# Altium footprint library SMT.PcbLib: 379 footprints (part 12 of 24) (continued)
## QFN50P800X800X100-57N [mm] "QFN, 56-Leads, Body 8,00x8,00mm, Pitch 0,50mm, Thermal Pad 6,25x6,25mm, IPC Medium Density"
height 1
pads (57):
  rrect50% 0.9x0.3 smd mask+0.03: 1(-3.95,3.25) 2(-3.95,2.75) 3(-3.95,2.25) 4(-3.95,1.75) 5(-3.95,1.25) 6(-3.95,0.75) 7(-3.95,0.25) 8(-3.95,-0.25) 9(-3.95,-0.75) 10(-3.95,-1.25) 11(-3.95,-1.75) 12(-3.95,-2.25) 13(-3.95,-2.75) 14(-3.95,-3.25) 29(3.95,-3.25) 30(3.95,-2.75) 31(3.95,-2.25) 32(3.95,-1.75) 33(3.95,-1.25) 34(3.95,-0.75) 35(3.95,-0.25) 36(3.95,0.25) 37(3.95,0.75) 38(3.95,1.25) 39(3.95,1.75) 40(3.95,2.25) 41(3.95,2.75) 42(3.95,3.25)
  rrect50% 0.3x0.9 smd mask+0.03: 15(-3.25,-3.95) 16(-2.75,-3.95) 17(-2.25,-3.95) 18(-1.75,-3.95) 19(-1.25,-3.95) 20(-0.75,-3.95) 21(-0.25,-3.95) 22(0.25,-3.95) 23(0.75,-3.95) 24(1.25,-3.95) 25(1.75,-3.95) 26(2.25,-3.95) 27(2.75,-3.95) 28(3.25,-3.95) 43(3.25,3.95) 44(2.75,3.95) 45(2.25,3.95) 46(1.75,3.95) 47(1.25,3.95) 48(0.75,3.95) 49(0.25,3.95) 50(-0.25,3.95) 51(-0.75,3.95) 52(-1.25,3.95) 53(-1.75,3.95) 54(-2.25,3.95) 55(-2.75,3.95) 56(-3.25,3.95)
  rect 6.25x6.25 hole 0.3 paste+0 mask-5: EPAD(0,0)
via 2.625,0.025 diameter 0.6 hole 0.3
via 1.325,0 diameter 0.6 hole 0.3
via 2.625,2.625 diameter 0.6 hole 0.3
via 2.625,-2.625 diameter 0.6 hole 0.3
via 2.625,-1.375 diameter 0.6 hole 0.3
via 2.625,1.25 diameter 0.6 hole 0.3
via 1.325,2.625 diameter 0.6 hole 0.3
via 1.325,-2.625 diameter 0.6 hole 0.3
via 1.325,-1.375 diameter 0.6 hole 0.3
via 1.325,1.25 diameter 0.6 hole 0.3
via 0,1.25 diameter 0.6 hole 0.3
via 0,-1.375 diameter 0.6 hole 0.3
via -2.625,-1.375 diameter 0.6 hole 0.3
via -2.625,1.25 diameter 0.6 hole 0.3
via -1.325,2.625 diameter 0.6 hole 0.3
via -1.325,0 diameter 0.6 hole 0.3
via -1.325,-1.375 diameter 0.6 hole 0.3
via -2.625,2.625 diameter 0.6 hole 0.3
via -2.625,-2.625 diameter 0.6 hole 0.3
via 0,-2.625 diameter 0.6 hole 0.3
via 0,2.625 diameter 0.6 hole 0.3
via -2.625,0 diameter 0.6 hole 0.3
via -1.325,-2.625 diameter 0.6 hole 0.3
via -1.325,1.25 diameter 0.6 hole 0.3
Top Overlay:
  circle w0.15: c-4.95,3.25 r0.25
  lines w0.15: -4.15,-3.8 -4.15,-4.15 -3.8,-4.15 ; -4.15,3.8 -4.15,4.15 -3.8,4.15 ; 3.8,-4.15 4.15,-4.15 4.15,-3.8 ; 3.8,4.15 4.15,4.15 4.15,3.8
Top Paste:
  region: 3.075,-0.45 3.075,0.45 2.175,0.45 2.175,-0.45
  region: 3.075,2.175 3.075,3.075 2.175,3.075 2.175,2.175
  region: 3.075,-3.075 3.075,-2.175 2.175,-2.175 2.175,-3.075
  region: 3.075,-1.825 3.075,-0.925 2.175,-0.925 2.175,-1.825
  region: 3.075,0.8 3.075,1.7 2.175,1.7 2.175,0.8
  region: 1.775,-0.45 1.775,0.45 0.875,0.45 0.875,-0.45
  region: 1.775,2.175 1.775,3.075 0.875,3.075 0.875,2.175
  region: 1.775,-3.075 1.775,-2.175 0.875,-2.175 0.875,-3.075
  region: 1.775,-1.825 1.775,-0.925 0.875,-0.925 0.875,-1.825
  region: 1.775,0.8 1.775,1.7 0.875,1.7 0.875,0.8
  region: 0.45,0.8 0.45,1.7 -0.45,1.7 -0.45,0.8
  region: 0.45,-1.825 0.45,-0.925 -0.45,-0.925 -0.45,-1.825
  region: -2.175,-1.825 -2.175,-0.925 -3.075,-0.925 -3.075,-1.825
  region: -2.175,0.8 -2.175,1.7 -3.075,1.7 -3.075,0.8
  region: -0.875,2.175 -0.875,3.075 -1.775,3.075 -1.775,2.175
  region: -0.875,-0.45 -0.875,0.45 -1.775,0.45 -1.775,-0.45
  region: -0.875,-1.825 -0.875,-0.925 -1.775,-0.925 -1.775,-1.825
  region: -0.875,0.8 -0.875,1.7 -1.775,1.7 -1.775,0.8
  region: -2.175,2.175 -2.175,3.075 -3.075,3.075 -3.075,2.175
  region: -2.175,-3.075 -2.175,-2.175 -3.075,-2.175 -3.075,-3.075
  region: 0.45,-3.075 0.45,-2.175 -0.45,-2.175 -0.45,-3.075
  region: 0.45,2.175 0.45,3.075 -0.45,3.075 -0.45,2.175
  region: -2.175,-0.45 -2.175,0.45 -3.075,0.45 -3.075,-0.45
  region: 0.45,-0.45 0.45,0.45 -0.45,0.45 -0.45,-0.45
  region: -0.875,-3.075 -0.875,-2.175 -1.775,-2.175 -1.775,-3.075
Top Solder:
  region: 3.125,-0.5 3.125,0.5 2.125,0.5 2.125,-0.5
  region: 3.125,2.125 3.125,3.125 2.125,3.125 2.125,2.125
  region: 3.125,-3.125 3.125,-2.125 2.125,-2.125 2.125,-3.125
  region: 3.125,-1.875 3.125,-0.875 2.125,-0.875 2.125,-1.875
  region: 3.125,0.75 3.125,1.75 2.125,1.75 2.125,0.75
  region: 1.825,-0.5 1.825,0.5 0.825,0.5 0.825,-0.5
  region: 1.825,2.125 1.825,3.125 0.825,3.125 0.825,2.125
  region: 1.825,-3.125 1.825,-2.125 0.825,-2.125 0.825,-3.125
  region: 1.825,-1.875 1.825,-0.875 0.825,-0.875 0.825,-1.875
  region: 1.825,0.75 1.825,1.75 0.825,1.75 0.825,0.75
  region: 0.5,0.75 0.5,1.75 -0.5,1.75 -0.5,0.75
  region: 0.5,-1.875 0.5,-0.875 -0.5,-0.875 -0.5,-1.875
  region: -2.125,-1.875 -2.125,-0.875 -3.125,-0.875 -3.125,-1.875
  region: -2.125,0.75 -2.125,1.75 -3.125,1.75 -3.125,0.75
  region: -0.825,2.125 -0.825,3.125 -1.825,3.125 -1.825,2.125
  region: -0.825,-0.5 -0.825,0.5 -1.825,0.5 -1.825,-0.5
  region: -0.825,-1.875 -0.825,-0.875 -1.825,-0.875 -1.825,-1.875
  region: -0.825,0.75 -0.825,1.75 -1.825,1.75 -1.825,0.75
  region: -2.125,2.125 -2.125,3.125 -3.125,3.125 -3.125,2.125
  region: -2.125,-3.125 -2.125,-2.125 -3.125,-2.125 -3.125,-3.125
  region: 0.5,-3.125 0.5,-2.125 -0.5,-2.125 -0.5,-3.125
  region: 0.5,2.125 0.5,3.125 -0.5,3.125 -0.5,2.125
  region: -2.125,-0.5 -2.125,0.5 -3.125,0.5 -3.125,-0.5
  region: -0.825,-3.125 -0.825,-2.125 -1.825,-2.125 -1.825,-3.125
  region: 0.5,-0.5 0.5,0.5 -0.5,0.5 -0.5,-0.5
Bottom Solder:
  region: 3.175,-3.175 3.175,3.175 -3.175,3.175 -3.175,-3.175
Mechanical 1:
  circle w0.2: c-3.1,3.1 r0.25
  lines w0.2: -4,-4 -4,4 4,4 4,-4 -4,-4
3D body "QFN56-8X8-5_2.STEP": height 0.92, standoff 0.02, extent -4,-4 4,4

## QFN50P800X800X100_HS-57N [mm] "QFN, 56-Leads, Body 8,00x8,00mm, Pitch 0,50mm, Thermal Pad 4,37x4,37mm, IPC Medium Density"
height 1
pads (57):
  rrect50% 0.9x0.3 smd mask+0.04: 1(-4.025,3.25) 2(-4.025,2.75) 3(-4.025,2.25) 4(-4.025,1.75) 5(-4.025,1.25) 6(-4.025,0.75) 7(-4.025,0.25) 8(-4.025,-0.25) 9(-4.025,-0.75) 10(-4.025,-1.25) 11(-4.025,-1.75) 12(-4.025,-2.25) 13(-4.025,-2.75) 14(-4.025,-3.25) 29(4.025,-3.25) 30(4.025,-2.75) 31(4.025,-2.25) 32(4.025,-1.75) 33(4.025,-1.25) 34(4.025,-0.75) 35(4.025,-0.25) 36(4.025,0.25) 37(4.025,0.75) 38(4.025,1.25) 39(4.025,1.75) 40(4.025,2.25) 41(4.025,2.75) 42(4.025,3.25)
  rrect50% 0.3x0.9 smd mask+0.04: 15(-3.25,-4.025) 16(-2.75,-4.025) 17(-2.25,-4.025) 18(-1.75,-4.025) 19(-1.25,-4.025) 20(-0.75,-4.025) 21(-0.25,-4.025) 22(0.25,-4.025) 23(0.75,-4.025) 24(1.25,-4.025) 25(1.75,-4.025) 26(2.25,-4.025) 27(2.75,-4.025) 28(3.25,-4.025) 43(3.25,4.025) 44(2.75,4.025) 45(2.25,4.025) 46(1.75,4.025) 47(1.25,4.025) 48(0.75,4.025) 49(0.25,4.025) 50(-0.25,4.025) 51(-0.75,4.025) 52(-1.25,4.025) 53(-1.75,4.025) 54(-2.25,4.025) 55(-2.75,4.025) 56(-3.25,4.025)
  rect 4.37x4.37 hole 0.3 copper offset 0.55,0.55 mask-10: EPAD(-0.55,-0.55)
via -1.65,1.65 diameter 0.7 hole 0.3
via -0.55,1.65 diameter 0.7 hole 0.3
via -1.65,0.55 diameter 0.7 hole 0.3
via -0.55,0.55 diameter 0.7 hole 0.3
via -1.65,-0.55 diameter 0.7 hole 0.3
via -1.65,-1.65 diameter 0.7 hole 0.3
via -0.55,-1.65 diameter 0.7 hole 0.3
via 0.55,-0.55 diameter 0.7 hole 0.3
via 1.65,-0.55 diameter 0.7 hole 0.3
via 0.55,-1.65 diameter 0.7 hole 0.3
via 1.65,-1.65 diameter 0.7 hole 0.3
via 0.55,1.65 diameter 0.7 hole 0.3
via 1.65,1.65 diameter 0.7 hole 0.3
via 1.65,0.55 diameter 0.7 hole 0.3
via 0.55,0.55 diameter 0.7 hole 0.3
Top Overlay:
  circle w0.15: c-4.8,4 r0.25
  lines w0.15: -4.2,3.6 -3.6,4.2 ; -4.1,-3.7 -3.6,-4.2 ; 3.6,-4.2 4.2,-3.6 ; 3.6,4.2 4.2,3.6
Top Paste:
  region: 1.7,-0.3 0.4,-0.3 0.4,-1.7 1.7,-1.7
  rectangle: -1.7,-1.7 -0.4,-0.3
  rectangle: -1.7,0.3 -0.4,1.7
  region: 1.7,1.7 0.4,1.7 0.4,0.3 1.7,0.3
Top Solder:
  region: 1.8,-0.2 0.3,-0.2 0.3,-1.8 1.8,-1.8
  rectangle: -1.8,-1.8 -0.3,-0.2
  rectangle: -1.8,0.2 -0.3,1.8
  region: 1.8,1.8 0.3,1.8 0.3,0.2 1.8,0.2
Mechanical 1:
  circle w0.2: c-3.05,3.05 r0.25
  lines w0.2: -4,-3.4 -3.4,-4 3.4,-4 4,-3.4 4,3.4 3.4,4 -3.4,4 -4,3.4 -4,-3.4
3D body "QFN50P800X800X100_HS-57N.step": height 1, standoff 0, extent -4.001,-4.001 4.001,4.001

## QFN50P900X900X80_HS63x63-65N [mm] "QFN, 64-Leads, Body 9,00x9,00mm, Pitch 0,50mm, Thermal Pad 6,2x6,2mm, IPC Medium Density"
height 0.8
pads (65):
  rrect50% 0.9x0.3 smd mask+0.05: 1(-4.525,3.75) 2(-4.525,3.25) 3(-4.525,2.75) 4(-4.525,2.25) 5(-4.525,1.75) 6(-4.525,1.25) 7(-4.525,0.75) 8(-4.525,0.25) 9(-4.525,-0.25) 10(-4.525,-0.75) 11(-4.525,-1.25) 12(-4.525,-1.75) 13(-4.525,-2.25) 14(-4.525,-2.75) 15(-4.525,-3.25) 16(-4.525,-3.75) 33(4.525,-3.75) 34(4.525,-3.25) 35(4.525,-2.75) 36(4.525,-2.25) 37(4.525,-1.75) 38(4.525,-1.25) 39(4.525,-0.75) 40(4.525,-0.25) 41(4.525,0.25) 42(4.525,0.75) 43(4.525,1.25) 44(4.525,1.75) 45(4.525,2.25) 46(4.525,2.75) 47(4.525,3.25) 48(4.525,3.75)
  rrect50% 0.3x0.9 smd mask+0.05: 17(-3.75,-4.525) 18(-3.25,-4.525) 19(-2.75,-4.525) 20(-2.25,-4.525) 21(-1.75,-4.525) 22(-1.25,-4.525) 23(-0.75,-4.525) 24(-0.25,-4.525) 25(0.25,-4.525) 26(0.75,-4.525) 27(1.25,-4.525) 28(1.75,-4.525) 29(2.25,-4.525) 30(2.75,-4.525) 31(3.25,-4.525) 32(3.75,-4.525) 49(3.75,4.525) 50(3.25,4.525) 51(2.75,4.525) 52(2.25,4.525) 53(1.75,4.525) 54(1.25,4.525) 55(0.75,4.525) 56(0.25,4.525) 57(-0.25,4.525) 58(-0.75,4.525) 59(-1.25,4.525) 60(-1.75,4.525) 61(-2.25,4.525) 62(-2.75,4.525) 63(-3.25,4.525) 64(-3.75,4.525)
  rect 6.3x6.3 hole 0.3 copper offset 0.5,-0.5 mask+0.05: EPAD(-0.5,0.5)
via 0.5,-0.5 diameter 0.6 hole 0.3
via -0.5,-0.5 diameter 0.6 hole 0.3
via -0.5,2.71 diameter 0.6 hole 0.3
via -0.5,1.71 diameter 0.6 hole 0.3
via 0.5,1.71 diameter 0.6 hole 0.3
via -0.5,-1.71 diameter 0.6 hole 0.3
via -0.5,-2.71 diameter 0.6 hole 0.3
via 0.5,-2.71 diameter 0.6 hole 0.3
via 0.5,-1.71 diameter 0.6 hole 0.3
via 0.5,2.71 diameter 0.6 hole 0.3
via 1.71,2.71 diameter 0.6 hole 0.3
via 2.71,2.71 diameter 0.6 hole 0.3
via 2.71,1.71 diameter 0.6 hole 0.3
via 1.71,1.71 diameter 0.6 hole 0.3
via 1.71,0.5 diameter 0.6 hole 0.3
via 2.71,0.5 diameter 0.6 hole 0.3
via 2.71,-0.5 diameter 0.6 hole 0.3
via 1.71,-0.5 diameter 0.6 hole 0.3
via 1.71,-1.71 diameter 0.6 hole 0.3
via 2.71,-1.71 diameter 0.6 hole 0.3
via 2.71,-2.71 diameter 0.6 hole 0.3
via 1.71,-2.71 diameter 0.6 hole 0.3
via -1.71,1.71 diameter 0.6 hole 0.3
via -2.71,1.71 diameter 0.6 hole 0.3
via -2.71,2.71 diameter 0.6 hole 0.3
via -1.71,2.71 diameter 0.6 hole 0.3
via -1.71,-0.5 diameter 0.6 hole 0.3
via -2.71,-0.5 diameter 0.6 hole 0.3
via -2.71,0.5 diameter 0.6 hole 0.3
via -1.71,0.5 diameter 0.6 hole 0.3
via -1.71,-2.71 diameter 0.6 hole 0.3
via -2.71,-2.71 diameter 0.6 hole 0.3
via -2.71,-1.71 diameter 0.6 hole 0.3
via -1.71,-1.71 diameter 0.6 hole 0.3
via 0.5,0.5 diameter 0.6 hole 0.3
Top Overlay:
  circle w0.15: c-5.3,4.5 r0.25
  lines w0.15: -4.65,-4.25 -4.65,-4.65 -4.25,-4.65 ; -4.65,4.25 -4.65,4.65 -4.25,4.65 ; 4.25,-4.65 4.65,-4.65 4.65,-4.25 ; 4.25,4.65 4.65,4.65 4.65,4.25
Top Paste:
  region: -0.76,0.76 -0.76,-0.76 0.76,-0.76 0.76,0.76
  region: -0.76,2.97 -0.76,1.45 0.76,1.45 0.76,2.97
  region: -0.76,-1.45 -0.76,-2.97 0.76,-2.97 0.76,-1.45
  region: 1.45,1.45 2.97,1.45 2.97,2.97 1.45,2.97
  region: 1.45,-0.76 2.97,-0.76 2.97,0.76 1.45,0.76
  region: 1.45,-2.97 2.97,-2.97 2.97,-1.45 1.45,-1.45
  region: -1.45,2.97 -2.97,2.97 -2.97,1.45 -1.45,1.45
  region: -1.45,0.76 -2.97,0.76 -2.97,-0.76 -1.45,-0.76
  region: -1.45,-1.45 -2.97,-1.45 -2.97,-2.97 -1.45,-2.97
Top Solder:
  region: -1.04,1.04 -1.04,-1.04 1.04,-1.04 1.04,1.04
  region: -1.04,3.2 -1.04,1.17 1.04,1.17 1.04,3.2
  region: -1.04,-1.17 -1.04,-3.2 1.04,-3.2 1.04,-1.17
  region: 1.17,1.17 3.2,1.17 3.2,3.2 1.17,3.2
  region: 1.17,-1.04 3.2,-1.04 3.2,1.04 1.17,1.04
  region: 1.17,-3.2 3.2,-3.2 3.2,-1.17 1.17,-1.17
  region: -1.17,3.2 -3.2,3.2 -3.2,1.17 -1.17,1.17
  region: -1.17,1.04 -3.2,1.04 -3.2,-1.04 -1.17,-1.04
  region: -1.17,-1.17 -3.2,-1.17 -3.2,-3.2 -1.17,-3.2
Mechanical 1:
  circle w0.2: c-3.55,3.55 r0.25
  lines w0.2: -4.5,-4.5 4.5,-4.5 4.5,4.5 -4.5,4.5 -4.5,-4.5
3D body "QFN50P900X900X80_HS-65N.step": height 0.8, standoff 0, extent -4.52,-4.52 4.52,4.52

## QFN50P900X900X80_HS-65N [mm] "QFN, 64-Leads, Body 9,00x9,00mm, Pitch 0,50mm, Thermal Pad 7,60x7,60mm, IPC Medium Density"
height 0.8
pads (65):
  rrect50% 0.9x0.3 smd mask+0.05: 1(-4.525,3.75) 2(-4.525,3.25) 3(-4.525,2.75) 4(-4.525,2.25) 5(-4.525,1.75) 6(-4.525,1.25) 7(-4.525,0.75) 8(-4.525,0.25) 9(-4.525,-0.25) 10(-4.525,-0.75) 11(-4.525,-1.25) 12(-4.525,-1.75) 13(-4.525,-2.25) 14(-4.525,-2.75) 15(-4.525,-3.25) 16(-4.525,-3.75) 33(4.525,-3.75) 34(4.525,-3.25) 35(4.525,-2.75) 36(4.525,-2.25) 37(4.525,-1.75) 38(4.525,-1.25) 39(4.525,-0.75) 40(4.525,-0.25) 41(4.525,0.25) 42(4.525,0.75) 43(4.525,1.25) 44(4.525,1.75) 45(4.525,2.25) 46(4.525,2.75) 47(4.525,3.25) 48(4.525,3.75)
  rrect50% 0.3x0.9 smd mask+0.05: 17(-3.75,-4.525) 18(-3.25,-4.525) 19(-2.75,-4.525) 20(-2.25,-4.525) 21(-1.75,-4.525) 22(-1.25,-4.525) 23(-0.75,-4.525) 24(-0.25,-4.525) 25(0.25,-4.525) 26(0.75,-4.525) 27(1.25,-4.525) 28(1.75,-4.525) 29(2.25,-4.525) 30(2.75,-4.525) 31(3.25,-4.525) 32(3.75,-4.525) 49(3.75,4.525) 50(3.25,4.525) 51(2.75,4.525) 52(2.25,4.525) 53(1.75,4.525) 54(1.25,4.525) 55(0.75,4.525) 56(0.25,4.525) 57(-0.25,4.525) 58(-0.75,4.525) 59(-1.25,4.525) 60(-1.75,4.525) 61(-2.25,4.525) 62(-2.75,4.525) 63(-3.25,4.525) 64(-3.75,4.525)
  rect 7.7x7.7 hole 0.3 copper offset 0.5,-0.5 mask+0.05: EPAD(-0.5,0.5)
via 0.5,-0.5 diameter 0.6 hole 0.3
via -0.5,-0.5 diameter 0.6 hole 0.3
via -0.5,2.71 diameter 0.6 hole 0.3
via -0.5,1.71 diameter 0.6 hole 0.3
via 0.5,1.71 diameter 0.6 hole 0.3
via -0.5,-1.71 diameter 0.6 hole 0.3
via -0.5,-2.71 diameter 0.6 hole 0.3
via 0.5,-2.71 diameter 0.6 hole 0.3
via 0.5,-1.71 diameter 0.6 hole 0.3
via 0.5,2.71 diameter 0.6 hole 0.3
via 1.71,2.71 diameter 0.6 hole 0.3
via 2.71,2.71 diameter 0.6 hole 0.3
via 2.71,1.71 diameter 0.6 hole 0.3
via 1.71,1.71 diameter 0.6 hole 0.3
via 1.71,0.5 diameter 0.6 hole 0.3
via 2.71,0.5 diameter 0.6 hole 0.3
via 2.71,-0.5 diameter 0.6 hole 0.3
via 1.71,-0.5 diameter 0.6 hole 0.3
via 1.71,-1.71 diameter 0.6 hole 0.3
via 2.71,-1.71 diameter 0.6 hole 0.3
via 2.71,-2.71 diameter 0.6 hole 0.3
via 1.71,-2.71 diameter 0.6 hole 0.3
via -1.71,1.71 diameter 0.6 hole 0.3
via -2.71,1.71 diameter 0.6 hole 0.3
via -2.71,2.71 diameter 0.6 hole 0.3
via -1.71,2.71 diameter 0.6 hole 0.3
via -1.71,-0.5 diameter 0.6 hole 0.3
via -2.71,-0.5 diameter 0.6 hole 0.3
via -2.71,0.5 diameter 0.6 hole 0.3
via -1.71,0.5 diameter 0.6 hole 0.3
via -1.71,-2.71 diameter 0.6 hole 0.3
via -2.71,-2.71 diameter 0.6 hole 0.3
via -2.71,-1.71 diameter 0.6 hole 0.3
via -1.71,-1.71 diameter 0.6 hole 0.3
via 0.5,0.5 diameter 0.6 hole 0.3
Top Overlay:
  circle w0.15: c-5.3,4.5 r0.25
  lines w0.15: -4.65,-4.25 -4.65,-4.65 -4.25,-4.65 ; -4.65,4.25 -4.65,4.65 -4.25,4.65 ; 4.25,-4.65 4.65,-4.65 4.65,-4.25 ; 4.25,4.65 4.65,4.65 4.65,4.25
Top Paste:
  region: -0.76,0.76 -0.76,-0.76 0.76,-0.76 0.76,0.76
  region: -0.76,2.97 -0.76,1.45 0.76,1.45 0.76,2.97
  region: -0.76,-1.45 -0.76,-2.97 0.76,-2.97 0.76,-1.45
  region: 1.45,1.45 2.97,1.45 2.97,2.97 1.45,2.97
  region: 1.45,-0.76 2.97,-0.76 2.97,0.76 1.45,0.76
  region: 1.45,-2.97 2.97,-2.97 2.97,-1.45 1.45,-1.45
  region: -1.45,2.97 -2.97,2.97 -2.97,1.45 -1.45,1.45
  region: -1.45,0.76 -2.97,0.76 -2.97,-0.76 -1.45,-0.76
  region: -1.45,-1.45 -2.97,-1.45 -2.97,-2.97 -1.45,-2.97
Top Solder:
  region: -1.04,1.04 -1.04,-1.04 1.04,-1.04 1.04,1.04
  region: -1.04,3.25 -1.04,1.17 1.04,1.17 1.04,3.25
  region: -1.04,-1.17 -1.04,-3.25 1.04,-3.25 1.04,-1.17
  region: 1.17,1.17 3.25,1.17 3.25,3.25 1.17,3.25
  region: 1.17,-1.04 3.25,-1.04 3.25,1.04 1.17,1.04
  region: 1.17,-3.25 3.25,-3.25 3.25,-1.17 1.17,-1.17
  region: -1.17,3.25 -3.25,3.25 -3.25,1.17 -1.17,1.17
  region: -1.17,1.04 -3.25,1.04 -3.25,-1.04 -1.17,-1.04
  region: -1.17,-1.17 -3.25,-1.17 -3.25,-3.25 -1.17,-3.25
Mechanical 1:
  circle w0.2: c-3.55,3.55 r0.25
  lines w0.2: -4.5,-4.5 4.5,-4.5 4.5,4.5 -4.5,4.5 -4.5,-4.5
3D body "QFN50P900X900X80_HS-65N.step": height 0.8, standoff 0, extent -4.52,-4.52 4.52,4.52

## QFN50P900X900X100-65N [mm] "QFN, 64-Leads, Body 9,0x9,0mm (max), Pitch 0,50mm, IPC Medium Density"
height 1
pads (65):
  rrect50% 0.9x0.3 smd mask+0.03: 1(-4.525,3.75) 2(-4.525,3.25) 3(-4.525,2.75) 4(-4.525,2.25) 5(-4.525,1.75) 6(-4.525,1.25) 7(-4.525,0.75) 8(-4.525,0.25) 9(-4.525,-0.25) 10(-4.525,-0.75) 11(-4.525,-1.25) 12(-4.525,-1.75) 13(-4.525,-2.25) 14(-4.525,-2.75) 15(-4.525,-3.25) 16(-4.525,-3.75) 33(4.525,-3.75) 34(4.525,-3.25) 35(4.525,-2.75) 36(4.525,-2.25) 37(4.525,-1.75) 38(4.525,-1.25) 39(4.525,-0.75) 40(4.525,-0.25) 41(4.525,0.25) 42(4.525,0.75) 43(4.525,1.25) 44(4.525,1.75) 45(4.525,2.25) 46(4.525,2.75) 47(4.525,3.25) 48(4.525,3.75)
  rrect50% 0.3x0.9 smd mask+0.03: 17(-3.75,-4.525) 18(-3.25,-4.525) 19(-2.75,-4.525) 20(-2.25,-4.525) 21(-1.75,-4.525) 22(-1.25,-4.525) 23(-0.75,-4.525) 24(-0.25,-4.525) 25(0.25,-4.525) 26(0.75,-4.525) 27(1.25,-4.525) 28(1.75,-4.525) 29(2.25,-4.525) 30(2.75,-4.525) 31(3.25,-4.525) 32(3.75,-4.525) 49(3.75,4.525) 50(3.25,4.525) 51(2.75,4.525) 52(2.25,4.525) 53(1.75,4.525) 54(1.25,4.525) 55(0.75,4.525) 56(0.25,4.525) 57(-0.25,4.525) 58(-0.75,4.525) 59(-1.25,4.525) 60(-1.75,4.525) 61(-2.25,4.525) 62(-2.75,4.525) 63(-3.25,4.525) 64(-3.75,4.525)
  rect 6.4x6.4 hole 0.3 paste-7 mask-7: EPAD(0,0)
via 2,-2.25 diameter 0.8 hole 0.3
via 2,2.25 diameter 0.8 hole 0.3
via 2,0 diameter 0.8 hole 0.3
via -2,-2.25 diameter 0.8 hole 0.3
via -2,2.25 diameter 0.8 hole 0.3
via -2,0 diameter 0.8 hole 0.3
via 0,2.25 diameter 0.8 hole 0.3
via 0,-2.25 diameter 0.8 hole 0.3
Top Overlay:
  circle w0.15: c-5.55,3.8 r0.25
  lines w0.15: -4.8,4.1 -4.1,4.8 ; -4.7,-4.1 -4.7,-4.7 -4.1,-4.7 ; 4.1,-4.7 4.7,-4.7 4.7,-4.1 ; 4.1,4.7 4.7,4.7 4.7,4.1
Top Paste:
  region: 2.675,-2.9 2.675,-1.6 1.375,-1.6 1.375,-2.9
  region: 2.675,1.6 2.675,2.9 1.375,2.9 1.375,1.6
  region: 2.675,-0.65 2.675,0.65 1.375,0.65 1.375,-0.65
  region: -1.325,-2.9 -1.325,-1.6 -2.625,-1.6 -2.625,-2.9
  region: -1.325,1.6 -1.325,2.9 -2.625,2.9 -2.625,1.6
  region: -1.325,-0.65 -1.325,0.65 -2.625,0.65 -2.625,-0.65
  region: 0.675,-0.65 0.675,0.65 -0.625,0.65 -0.625,-0.65
  region: 0.675,1.6 0.675,2.9 -0.625,2.9 -0.625,1.6
  region: 0.675,-2.9 0.675,-1.6 -0.625,-1.6 -0.625,-2.9
Top Solder:
  region: 2.775,-3.025 2.775,-1.525 1.275,-1.525 1.275,-3.025
  region: 2.775,1.475 2.775,2.975 1.275,2.975 1.275,1.475
  region: 2.775,-0.775 2.775,0.725 1.275,0.725 1.275,-0.775
  region: -1.225,-3.025 -1.225,-1.525 -2.725,-1.525 -2.725,-3.025
  region: -1.225,1.475 -1.225,2.975 -2.725,2.975 -2.725,1.475
  region: -1.225,-0.775 -1.225,0.725 -2.725,0.725 -2.725,-0.775
  region: 0.775,-0.775 0.775,0.725 -0.725,0.725 -0.725,-0.775
  region: 0.775,1.475 0.775,2.975 -0.725,2.975 -0.725,1.475
  region: 0.775,-3.025 0.775,-1.525 -0.725,-1.525 -0.725,-3.025
Bottom Solder:
  region: -3.25,3.25 -3.25,-3.25 3.25,-3.25 3.25,3.25
Mechanical 1:
  circle w0.2: c-3.55,3.55 r0.25
  lines w0.2: -4.5,-4.5 -4.5,4.5 4.5,4.5 4.5,-4.5 -4.5,-4.5
3D body "User Library-QFN64-2.STEP": height 0.9, standoff 0, extent -4.52,-4.5 4.52,4.54

## QFN50P900X900X100-65N - HS1 [mm] "QFN, 64-Leads, Body 9,0x9,0mm (max), Pitch 0,50mm, IPC Medium Density"
height 1
pads (65):
  rrect50% 0.9x0.3 smd mask+0.03: 1(-4.525,3.75) 2(-4.525,3.25) 3(-4.525,2.75) 4(-4.525,2.25) 5(-4.525,1.75) 6(-4.525,1.25) 7(-4.525,0.75) 8(-4.525,0.25) 9(-4.525,-0.25) 10(-4.525,-0.75) 11(-4.525,-1.25) 12(-4.525,-1.75) 13(-4.525,-2.25) 14(-4.525,-2.75) 15(-4.525,-3.25) 16(-4.525,-3.75) 33(4.525,-3.75) 34(4.525,-3.25) 35(4.525,-2.75) 36(4.525,-2.25) 37(4.525,-1.75) 38(4.525,-1.25) 39(4.525,-0.75) 40(4.525,-0.25) 41(4.525,0.25) 42(4.525,0.75) 43(4.525,1.25) 44(4.525,1.75) 45(4.525,2.25) 46(4.525,2.75) 47(4.525,3.25) 48(4.525,3.75)
  rrect50% 0.3x0.9 smd mask+0.03: 17(-3.75,-4.525) 18(-3.25,-4.525) 19(-2.75,-4.525) 20(-2.25,-4.525) 21(-1.75,-4.525) 22(-1.25,-4.525) 23(-0.75,-4.525) 24(-0.25,-4.525) 25(0.25,-4.525) 26(0.75,-4.525) 27(1.25,-4.525) 28(1.75,-4.525) 29(2.25,-4.525) 30(2.75,-4.525) 31(3.25,-4.525) 32(3.75,-4.525) 49(3.75,4.525) 50(3.25,4.525) 51(2.75,4.525) 52(2.25,4.525) 53(1.75,4.525) 54(1.25,4.525) 55(0.75,4.525) 56(0.25,4.525) 57(-0.25,4.525) 58(-0.75,4.525) 59(-1.25,4.525) 60(-1.75,4.525) 61(-2.25,4.525) 62(-2.75,4.525) 63(-3.25,4.525) 64(-3.75,4.525)
  rect 6.4x6.4 hole 0.3 copper offset -0.5,-0.5 paste+0 mask-20: EPAD(0.5,0.5)
via 0.5,-0.5 diameter 0.6 hole 0.3
via -0.5,-0.5 diameter 0.6 hole 0.3
via -0.5,0.5 diameter 0.6 hole 0.3
via -2.71,0.5 diameter 0.6 hole 0.3
via -2.71,-0.5 diameter 0.6 hole 0.3
via -1.71,-0.5 diameter 0.6 hole 0.3
via 1.71,0.5 diameter 0.6 hole 0.3
via 1.71,-0.5 diameter 0.6 hole 0.3
via 2.71,-0.5 diameter 0.6 hole 0.3
via -0.5,2.71 diameter 0.6 hole 0.3
via -0.5,1.71 diameter 0.6 hole 0.3
via 0.5,1.71 diameter 0.6 hole 0.3
via -0.5,-1.71 diameter 0.6 hole 0.3
via -0.5,-2.71 diameter 0.6 hole 0.3
via 0.5,-2.71 diameter 0.6 hole 0.3
via 1.71,-1.71 diameter 0.6 hole 0.3
via 1.71,-2.71 diameter 0.6 hole 0.3
via 2.71,-2.71 diameter 0.6 hole 0.3
via 1.71,2.71 diameter 0.6 hole 0.3
via 1.71,1.71 diameter 0.6 hole 0.3
via 2.71,1.71 diameter 0.6 hole 0.3
via -2.71,2.71 diameter 0.6 hole 0.3
via -2.71,1.71 diameter 0.6 hole 0.3
via -1.71,1.71 diameter 0.6 hole 0.3
via -2.71,-1.71 diameter 0.6 hole 0.3
via -2.71,-2.71 diameter 0.6 hole 0.3
via -1.71,-2.71 diameter 0.6 hole 0.3
via -1.71,-1.71 diameter 0.6 hole 0.3
via -1.71,0.5 diameter 0.6 hole 0.3
via 0.5,-1.71 diameter 0.6 hole 0.3
via 2.71,0.5 diameter 0.6 hole 0.3
via -1.71,2.71 diameter 0.6 hole 0.3
via 0.5,2.71 diameter 0.6 hole 0.3
via 2.71,2.71 diameter 0.6 hole 0.3
via 2.71,-1.71 diameter 0.6 hole 0.3
Top Overlay:
  circle w0.15: c-5.55,3.8 r0.25
  lines w0.15: -4.8,4.1 -4.1,4.8 ; -4.7,-4.1 -4.7,-4.7 -4.1,-4.7 ; 4.1,-4.7 4.7,-4.7 4.7,-4.1 ; 4.1,4.7 4.7,4.7 4.7,4.1
Top Paste:
  region: -0.76,0.76 -0.76,-0.76 0.76,-0.76 0.76,0.76
  region: -2.97,2.97 -2.97,1.45 -1.45,1.45 -1.45,2.97
  region: -0.76,2.97 -0.76,1.45 0.76,1.45 0.76,2.97
  region: 1.45,2.97 1.45,1.45 2.97,1.45 2.97,2.97
  region: -0.76,-1.45 -0.76,-2.97 0.76,-2.97 0.76,-1.45
  region: 1.45,0.76 1.45,-0.76 2.97,-0.76 2.97,0.76
  region: -2.97,0.76 -2.97,-0.76 -1.45,-0.76 -1.45,0.76
  region: 1.45,-1.45 1.45,-2.97 2.97,-2.97 2.97,-1.45
  region: -2.97,-1.45 -2.97,-2.97 -1.45,-2.97 -1.45,-1.45
Top Solder:
  region: -1.04,1.04 -1.04,-1.04 1.04,-1.04 1.04,1.04
  region: -3.25,1.04 -3.25,-1.04 -1.17,-1.04 -1.17,1.04
  region: 1.17,1.04 1.17,-1.04 3.25,-1.04 3.25,1.04
  region: -1.04,3.25 -1.04,1.17 1.04,1.17 1.04,3.25
  region: -1.04,-1.17 -1.04,-3.25 1.04,-3.25 1.04,-1.17
  region: 1.17,-1.17 1.17,-3.25 3.25,-3.25 3.25,-1.17
  region: 1.17,3.25 1.17,1.17 3.25,1.17 3.25,3.25
  region: -3.25,3.25 -3.25,1.17 -1.17,1.17 -1.17,3.25
  region: -3.25,-1.17 -3.25,-3.25 -1.17,-3.25 -1.17,-1.17
Bottom Solder:
  region: -3.25,3.25 -3.25,-3.25 3.25,-3.25 3.25,3.25
Mechanical 1:
  circle w0.2: c-3.55,3.55 r0.25
  lines w0.2: -4.5,-4.5 -4.5,4.5 4.5,4.5 4.5,-4.5 -4.5,-4.5
3D body "User Library-QFN64-2.STEP": height 0.9, standoff 0, extent -4.52,-4.5 4.52,4.54

## QFN50P1000X1000X90-72N [mm] "QFN, 72-Leads, Body 10,0x10,0mm (max), Pitch 0,50mm, IPC Medium Density"
height 0.9
pads (73):
  rrect50% 1x0.3 smd mask+0.03: 1(-5,4.25) 2(-5,3.75) 3(-5,3.25) 4(-5,2.75) 5(-5,2.25) 6(-5,1.75) 7(-5,1.25) 8(-5,0.75) 9(-5,0.25) 10(-5,-0.25) 11(-5,-0.75) 12(-5,-1.25) 13(-5,-1.75) 14(-5,-2.25) 15(-5,-2.75) 16(-5,-3.25) 17(-5,-3.75) 18(-5,-4.25) 37(5,-4.25) 38(5,-3.75) 39(5,-3.25) 40(5,-2.75) 41(5,-2.25) 42(5,-1.75) 43(5,-1.25) 44(5,-0.75) 45(5,-0.25) 46(5,0.25) 47(5,0.75) 48(5,1.25) 49(5,1.75) 50(5,2.25) 51(5,2.75) 52(5,3.25) 53(5,3.75) 54(5,4.25)
  rrect50% 0.3x1 smd mask+0.03: 19(-4.25,-5) 20(-3.75,-5) 21(-3.25,-5) 22(-2.75,-5) 23(-2.25,-5) 24(-1.75,-5) 25(-1.25,-5) 26(-0.75,-5) 27(-0.25,-5) 28(0.25,-5) 29(0.75,-5) 30(1.25,-5) 31(1.75,-5) 32(2.25,-5) 33(2.75,-5) 34(3.25,-5) 35(3.75,-5) 36(4.25,-5) 55(4.25,5) 56(3.75,5) 57(3.25,5) 58(2.75,5) 59(2.25,5) 60(1.75,5) 61(1.25,5) 62(0.75,5) 63(0.25,5) 64(-0.25,5) 65(-0.75,5) 66(-1.25,5) 67(-1.75,5) 68(-2.25,5) 69(-2.75,5) 70(-3.25,5) 71(-3.75,5) 72(-4.25,5)
  rect 8.5x8.5 hole 0.3 paste-25 mask-25: EPAD(0,0)
via -3,3 diameter 0.8 hole 0.3
via -1,3 diameter 0.8 hole 0.3
via 1,3 diameter 0.8 hole 0.3
via 3,3 diameter 0.8 hole 0.3
via -3,1 diameter 0.8 hole 0.3
via -1,1 diameter 0.8 hole 0.3
via 1,1 diameter 0.8 hole 0.3
via 3,1 diameter 0.8 hole 0.3
via -3,-1 diameter 0.8 hole 0.3
via -1,-1 diameter 0.8 hole 0.3
via 1,-1 diameter 0.8 hole 0.3
via 3,-1 diameter 0.8 hole 0.3
via -3,-3 diameter 0.8 hole 0.3
via -1,-3 diameter 0.8 hole 0.3
via 1,-3 diameter 0.8 hole 0.3
via 3,-3 diameter 0.8 hole 0.3
Top Overlay:
  circle w0.15: c-5.975,4.25 r0.25
  lines w0.15: -5,-4.55 -5,-5 -4.55,-5 ; -5,4.55 -5,5 -4.55,5 ; 4.55,-5 5,-5 5,-4.55 ; 4.55,5 5,5 5,4.55
Top Paste:
  region: -2.337,-3.643 -2.337,-2.343 -3.637,-2.343 -3.637,-3.643
  region: -0.35,-3.65 -0.35,-2.35 -1.65,-2.35 -1.65,-3.65
  region: 3.675,-3.65 3.675,-2.35 2.375,-2.35 2.375,-3.65
  region: 1.65,-3.675 1.65,-2.375 0.35,-2.375 0.35,-3.675
  region: -2.337,-1.643 -2.337,-0.343 -3.637,-0.343 -3.637,-1.643
  region: -0.35,-1.65 -0.35,-0.35 -1.65,-0.35 -1.65,-1.65
  region: 3.675,-1.65 3.675,-0.35 2.375,-0.35 2.375,-1.65
  region: 1.65,-1.675 1.65,-0.375 0.35,-0.375 0.35,-1.675
  region: -2.337,0.357 -2.337,1.657 -3.637,1.657 -3.637,0.357
  region: -0.35,0.35 -0.35,1.65 -1.65,1.65 -1.65,0.35
  region: 3.675,0.35 3.675,1.65 2.375,1.65 2.375,0.35
  region: 1.65,0.325 1.65,1.625 0.35,1.625 0.35,0.325
  region: 1.65,2.325 1.65,3.625 0.35,3.625 0.35,2.325
  region: 3.675,2.35 3.675,3.65 2.375,3.65 2.375,2.35
  region: -0.35,2.35 -0.35,3.65 -1.65,3.65 -1.65,2.35
  region: -2.337,2.357 -2.337,3.657 -3.637,3.657 -3.637,2.357
Top Solder:
  region: -2.125,-3.875 -2.125,-2.125 -3.875,-2.125 -3.875,-3.875
  region: -0.125,-3.875 -0.125,-2.125 -1.875,-2.125 -1.875,-3.875
  region: 1.875,-3.875 1.875,-2.125 0.125,-2.125 0.125,-3.875
  region: 3.875,-3.875 3.875,-2.125 2.125,-2.125 2.125,-3.875
  region: 3.875,-1.875 3.875,-0.125 2.125,-0.125 2.125,-1.875
  region: 1.875,-1.875 1.875,-0.125 0.125,-0.125 0.125,-1.875
  region: -0.125,-1.875 -0.125,-0.125 -1.875,-0.125 -1.875,-1.875
  region: -2.125,-1.875 -2.125,-0.125 -3.875,-0.125 -3.875,-1.875
  region: -2.125,2.125 -2.125,3.875 -3.875,3.875 -3.875,2.125
  region: -0.125,2.125 -0.125,3.875 -1.875,3.875 -1.875,2.125
  region: 1.875,2.125 1.875,3.875 0.125,3.875 0.125,2.125
  region: 3.875,2.125 3.875,3.875 2.125,3.875 2.125,2.125
  region: 3.875,0.125 3.875,1.875 2.125,1.875 2.125,0.125
  region: 1.875,0.125 1.875,1.875 0.125,1.875 0.125,0.125
  region: -0.125,0.125 -0.125,1.875 -1.875,1.875 -1.875,0.125
  region: -2.125,0.125 -2.125,1.875 -3.875,1.875 -3.875,0.125
Bottom Solder:
  region: -4.25,4.25 4.25,4.25 4.25,-4.25 -4.25,-4.25
Mechanical 1:
  circle w0.2: c-3.95,3.95 r0.25
  lines w0.2: -5,-5 -5,5 5,5 5,-5 -5,-5
3D body: height 0.9, standoff 0.05, extent -5,-5 5,5